# Altium footprint library ALL.PcbLib: 153 footprints (part 5 of 11)
Each footprint in its own frame and in the unit in brackets; x right, y up, seen from the top. Pads: shape width x height; smd on the part's side, far side on the other; paste and mask are expansions set on the pad; w line width, h text height; cw(c..) or ccw(c..) is an arc to the next point about the centre after c.
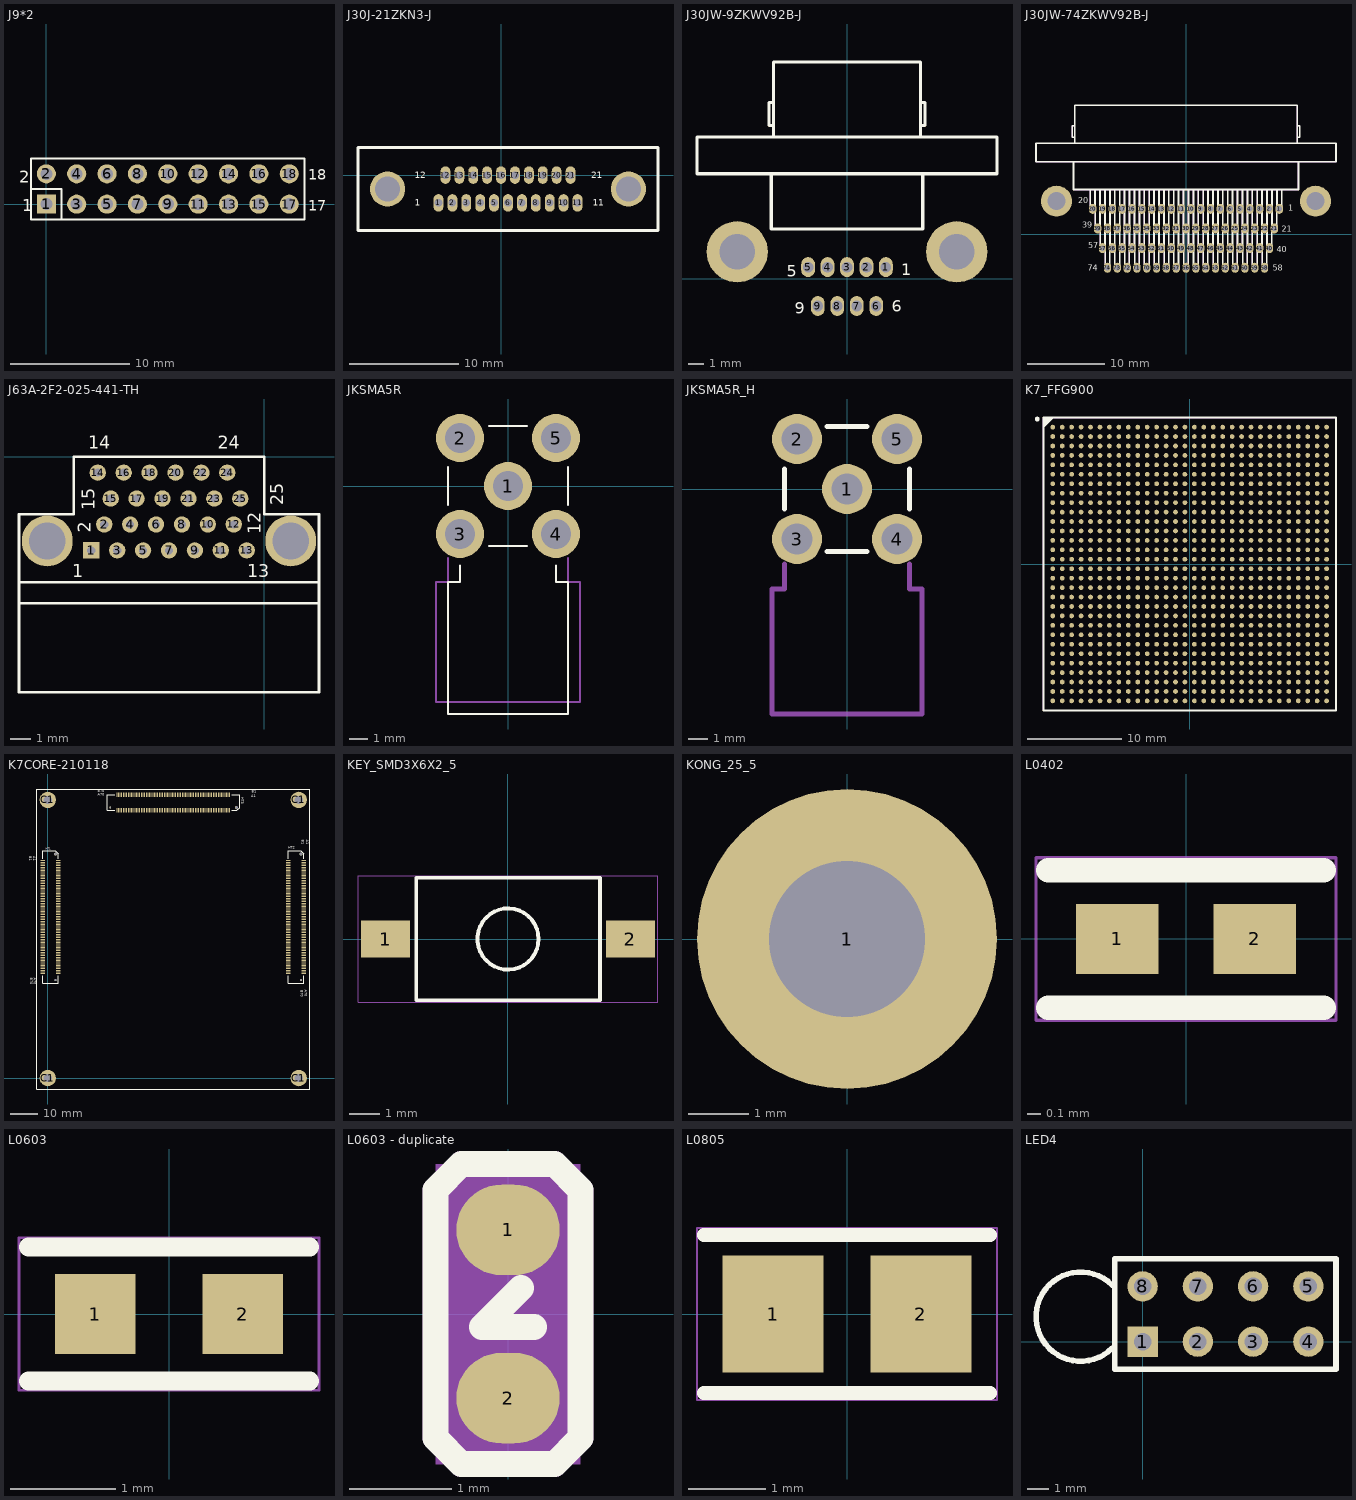
[diagram p4: the footprints below, top view; thin cyan lines are the x and y axes]

## J9*2 [mm]
pads (18):
  rect 1.6x1.6 hole 1: 1(0,0)
  round 1.6 hole 1: 2(0,2.54) 3(2.54,0) 4(2.54,2.54) 5(5.08,0) 6(5.08,2.54) 7(7.62,0) 8(7.62,2.54) 9(10.16,0) 10(10.16,2.54) 11(12.7,0) 12(12.7,2.54) 13(15.24,0) 14(15.24,2.54) 15(17.78,0) 16(17.78,2.54) 17(20.32,0) 18(20.32,2.54)
Top Overlay:
  lines w0.178: -1.27,1.27 1.27,1.27 1.27,-1.27 ; -1.27,-1.27 21.59,-1.27 21.59,3.81 -1.27,3.81 -1.27,-1.27
  text "18" at 21.895,2.032 h0.89
  text "17" at 21.92,-0.559 h0.89
  text "1" at -2.032,-0.584 h1.02
  text "2" at -2.286,1.778 h1.02

## J30J-21ZKN3-J [mm]
pads (23):
  oval 0.9x1.6 hole 0.7: 1(-5.715,-2.54) 2(-4.445,-2.54) 3(-3.175,-2.54) 4(-1.905,-2.54) 5(-0.635,-2.54) 6(0.635,-2.54) 7(1.905,-2.54) 8(3.175,-2.54) 9(4.445,-2.54) 10(5.715,-2.54) 11(6.985,-2.54) 12(-5.08,0) 13(-3.81,0) 14(-2.54,0) 15(-1.27,0) 16(0,0) 17(1.27,0) 18(2.54,0) 19(3.81,0) 20(5.08,0) 21(6.35,0)
  round 3.2 hole 2.3: ""(-10.365,-1.27) ""(11.635,-1.27)
Top Overlay:
  lines w0.254: -13.065,-5.07 14.335,-5.07 14.335,-1.27 14.335,2.53 -10.365,2.53 -13.065,2.53 -13.065,-1.27 -13.065,-5.07
  text "11" at 8.382,-3.048 h1.02
  text "1" at -7.874,-3.048 h1.02
  text "12" at -7.874,-0.508 h1.02
  text "21" at 8.255,-0.508 h1.02

## J30JW-9ZKWV92B-J [mm]
pads (11):
  oval 0.9x1.3 hole 0.7: 1(2.54,0.77) 2(1.27,0.77) 3(0,0.77) 4(-1.27,0.77) 5(-2.54,0.77) 6(1.905,-1.77) 7(0.635,-1.77) 8(-0.635,-1.77) 9(-1.905,-1.77)
  round 4 hole 2.3 unplated: ""(-7.175,1.77) ""(7.175,1.77)
Top Overlay:
  lines w0.203: -4.95,6.87 -4.95,3.27 4.95,3.27 4.95,6.87 ; -4.8,9.27 -4.8,14.17 -4.465,14.17 -2.675,14.17 -0.51,14.17 ; -4.8,10.02 -5.1,10.02 -5.1,10.82 -5.1,11.52 -4.8,11.52 ; -0.635,14.17 2.675,14.17 4.465,14.17 4.8,14.17 4.8,9.27 ; 4.8,10.02 5.1,10.02 5.1,10.82 5.1,11.52 4.8,11.52 ; -9.8,6.87 -9.8,9.27 8.3,9.27 9.8,9.27 9.8,6.87 -8.3,6.87 -9.8,6.87
  text "9" at -3.429,-2.286 h0.76
  text "5" at -3.937,0.127 h0.76
  text "6" at 2.921,-2.159 h0.76
  text "1" at 3.556,0.254 h0.76
Mechanical 1:
  lines w0.013: -8.3,6.87 -9.8,6.87 -9.8,9.27 -8.3,9.27 ; -4.95,3.27 -4.95,6.87 ; -4.8,9.27 -4.8,14.17 -4.465,14.17 -2.675,14.17 -0.51,14.17 ; -4.8,10.02 -5.1,10.02 -5.1,10.82 -5.1,11.52 -4.8,11.52 ; 0.51,14.17 2.675,14.17 4.465,14.17 4.8,14.17 4.8,9.27 ; 4.8,10.02 5.1,10.02 5.1,10.82 5.1,11.52 4.8,11.52 ; 4.95,3.27 4.95,6.87 ; 8.3,6.87 9.8,6.87 9.8,9.27 8.3,9.27

## J30JW-74ZKWV92B-J [mm]
pads (76):
  oval 0.95x1.3 hole 0.7: 1(12.065,3.31) 2(10.795,3.31) 3(9.525,3.31) 4(8.255,3.31) 5(6.985,3.31) 6(5.715,3.31) 7(4.445,3.31) 8(3.175,3.31) 9(1.905,3.31) 10(0.635,3.31) 11(-0.635,3.31) 12(-1.905,3.31) 13(-3.175,3.31) 14(-4.445,3.31) 15(-5.715,3.31) 16(-6.985,3.31) 17(-8.255,3.31) 18(-9.525,3.31) 19(-10.795,3.31) 20(-12.065,3.31) 21(11.43,0.77) 22(10.16,0.77) 23(8.89,0.77) 24(7.62,0.77) 25(6.35,0.77) 26(5.08,0.77) 27(3.81,0.77) 28(2.54,0.77) 29(1.27,0.77) 30(0,0.77) 31(-1.27,0.77) 32(-2.54,0.77) 33(-3.81,0.77) 34(-5.08,0.77) 35(-6.35,0.77) 36(-7.62,0.77) 37(-8.89,0.77) 38(-10.16,0.77) 39(-11.43,0.77) 40(10.795,-1.77) 41(9.525,-1.77) 42(8.255,-1.77) 43(6.985,-1.77) 44(5.715,-1.77) 45(4.445,-1.77) 46(3.175,-1.77) 47(1.905,-1.77) 48(0.635,-1.77) 49(-0.635,-1.77) 50(-1.905,-1.77) 51(-3.175,-1.77) 52(-4.445,-1.77) 53(-5.715,-1.77) 54(-6.985,-1.77) 55(-8.255,-1.77) 56(-9.525,-1.77) 57(-10.795,-1.77) 58(10.16,-4.31) 59(8.89,-4.31) 60(7.62,-4.31) 61(6.35,-4.31) 62(5.08,-4.31) 63(3.81,-4.31) 64(2.54,-4.31) 65(1.27,-4.31) 66(0,-4.31) 67(-1.27,-4.31) 68(-2.54,-4.31) 69(-3.81,-4.31) 70(-5.08,-4.31) 71(-6.35,-4.31) 72(-7.62,-4.31) 73(-8.89,-4.31) 74(-10.16,-4.31)
  round 4 hole 2.3: ""(-16.75,4.31) ""(16.75,4.31)
Top Overlay:
  drawing of 232 lines, arcs and shapes, not listed
  text "1" at 13.208,3.048 h0.76
  text "21" at 12.363,0.358 h0.76
  text "40" at 11.728,-2.309 h0.76
  text "58" at 11.22,-4.722 h0.76
  text "74" at -12.7,-4.691 h0.76
  text "57" at -12.656,-1.801 h0.76
  text "39" at -13.418,0.866 h0.76
  text "20" at -13.926,4.041 h0.76
Mechanical 1:
  drawing of 232 lines, arcs and shapes, not listed

## J63A-2F2-025-441-TH [mm]
pads (27):
  rect 0.8x0.8 hole 0.4: 1(-8.475,-4.58)
  round 0.8 hole 0.4: 2(-7.84,-3.31) 3(-7.205,-4.58) 4(-6.57,-3.31) 5(-5.935,-4.58) 6(-5.3,-3.31) 7(-4.665,-4.58) 8(-4.03,-3.31) 9(-3.395,-4.58) 10(-2.76,-3.31) 11(-2.125,-4.58) 12(-1.49,-3.31) 13(-0.855,-4.58) 14(-8.157,-0.77) 15(-7.522,-2.04) 16(-6.887,-0.77) 17(-6.252,-2.04) 18(-5.617,-0.77) 19(-4.982,-2.04) 20(-4.347,-0.77) 21(-3.712,-2.04) 22(-3.077,-0.77) 23(-2.442,-2.04) 24(-1.807,-0.77) 25(-1.172,-2.04)
  round 2.5 hole 1.8 unplated: ""(-10.635,-4.12) ""(1.305,-4.12)
Top Overlay:
  lines w0.127: -12.02,-7.17 2.69,-7.17 ; -12.02,-6.142 2.69,-6.142 ; -12.02,-11.54 -12.02,-2.8 -9.33,-2.8 -9.33,0 0,0 0,-2.8 2.69,-2.8 2.69,-11.54 -12.02,-11.54
  text "1" at -9.398,-5.905 h0.64
  text "13" at -0.826,-5.905 h0.64
  text "2" at -8.509,-3.708 h0.64
  text "15" at -8.306,-2.616 h0.64
  text "14" at -8.636,0.406 h0.64
  text "24" at -2.286,0.406 h0.64
  text "25" at 0.94,-2.362 h0.64
  text "12" at -0.178,-3.785 h0.64

## JKSMA5R [mil]
pads (5):
  round 100 hole 62: 1(0,0) 2(-100,100) 3(-100,-100) 4(100,-100) 5(100,100)
Top Overlay:
  lines w3.94: -125,-40 -125,40 ; -100,-165 -100,-200 -125,-200 -125,-475 125,-475 125,-200 100,-200 100,-165 ; -40,-125 40,-125 ; -40,125 40,125 ; 125,-40 125,40
Mechanical 1:
  lines w3.94: -125,-150 -125,-200 -150,-200 -150,-450 150,-450 150,-200 125,-200 125,-150

## JKSMA5R_H [mil]
pads (5):
  round 100 hole 62: 1(0,0) 2(-100,100) 3(-100,-100) 4(100,-100) 5(100,100)
Top Overlay:
  lines w10: -125,-40 -125,40 ; -40,-125 40,-125 ; -40,125 40,125 ; 125,-40 125,40
Mechanical 1:
  lines w10: -125,-150 -125,-200 -150,-200 -150,-450 150,-450 150,-200 125,-200 125,-150

## K7_FFG900 [mil] "K7_FFG900"
pads (900):
  round 19.68 smd: A1(-570.86,570.87) A2(-531.49,570.87) A3(-492.12,570.87) A4(-452.75,570.87) A5(-413.38,570.87) A6(-374.01,570.87) A7(-334.64,570.87) A8(-295.27,570.87) A9(-255.9,570.87) A10(-216.53,570.87) A11(-177.16,570.87) A12(-137.79,570.87) A13(-98.42,570.87) A14(-59.05,570.87) A15(-19.68,570.87) A16(19.69,570.87) A17(59.06,570.87) A18(98.43,570.87) A19(137.8,570.87) A20(177.17,570.87) A21(216.54,570.87) A22(255.91,570.87) A23(295.28,570.87) A24(334.65,570.87) A25(374.02,570.87) A26(413.39,570.87) A27(452.76,570.87) A28(492.13,570.87) A29(531.5,570.87) A30(570.87,570.87) AA1(-570.86,-216.53) AA2(-531.49,-216.53) AA3(-492.12,-216.53) AA4(-452.75,-216.53) AA5(-413.38,-216.53) AA6(-374.01,-216.53) AA7(-334.64,-216.53) AA8(-295.27,-216.53) AA9(-255.9,-216.53) AA10(-216.53,-216.53) AA11(-177.16,-216.53) AA12(-137.79,-216.53) AA13(-98.42,-216.53) AA14(-59.05,-216.53) AA15(-19.68,-216.53) AA16(19.69,-216.53) AA17(59.06,-216.53) AA18(98.43,-216.53) AA19(137.8,-216.53) AA20(177.17,-216.53) AA21(216.54,-216.53) AA22(255.91,-216.53) AA23(295.28,-216.53) AA24(334.65,-216.53) AA25(374.02,-216.53) AA26(413.39,-216.53) AA27(452.76,-216.53) AA28(492.13,-216.53) AA29(531.5,-216.53) AA30(570.87,-216.53) AB1(-570.86,-255.9) AB2(-531.49,-255.9) AB3(-492.12,-255.9) AB4(-452.75,-255.9) AB5(-413.38,-255.9) AB6(-374.01,-255.9) AB7(-334.64,-255.9) AB8(-295.27,-255.9) AB9(-255.9,-255.9) AB10(-216.53,-255.9) AB11(-177.16,-255.9) AB12(-137.79,-255.9) AB13(-98.42,-255.9) AB14(-59.05,-255.9) AB15(-19.68,-255.9) AB16(19.69,-255.9) AB17(59.06,-255.9) AB18(98.43,-255.9) AB19(137.8,-255.9) AB20(177.17,-255.9) AB21(216.54,-255.9) AB22(255.91,-255.9) AB23(295.28,-255.9) AB24(334.65,-255.9) AB25(374.02,-255.9) AB26(413.39,-255.9) AB27(452.76,-255.9) AB28(492.13,-255.9) AB29(531.5,-255.9) AB30(570.87,-255.9) AC1(-570.86,-295.27) AC2(-531.49,-295.27) AC3(-492.12,-295.27) AC4(-452.75,-295.27) AC5(-413.38,-295.27) AC6(-374.01,-295.27) AC7(-334.64,-295.27) AC8(-295.27,-295.27) AC9(-255.9,-295.27) AC10(-216.53,-295.27) AC11(-177.16,-295.27) AC12(-137.79,-295.27) AC13(-98.42,-295.27) AC14(-59.05,-295.27) AC15(-19.68,-295.27) AC16(19.69,-295.27) AC17(59.06,-295.27) AC18(98.43,-295.27) AC19(137.8,-295.27) AC20(177.17,-295.27) AC21(216.54,-295.27) AC22(255.91,-295.27) AC23(295.28,-295.27) AC24(334.65,-295.27) AC25(374.02,-295.27) AC26(413.39,-295.27) AC27(452.76,-295.27) AC28(492.13,-295.27) AC29(531.5,-295.27) AC30(570.87,-295.27) AD1(-570.86,-334.64) AD2(-531.49,-334.64) AD3(-492.12,-334.64) AD4(-452.75,-334.64) AD5(-413.38,-334.64) AD6(-374.01,-334.64) AD7(-334.64,-334.64) AD8(-295.27,-334.64) AD9(-255.9,-334.64) AD10(-216.53,-334.64) AD11(-177.16,-334.64) AD12(-137.79,-334.64) AD13(-98.42,-334.64) AD14(-59.05,-334.64) AD15(-19.68,-334.64) AD16(19.69,-334.64) AD17(59.06,-334.64) AD18(98.43,-334.64) AD19(137.8,-334.64) AD20(177.17,-334.64) AD21(216.54,-334.64) AD22(255.91,-334.64) AD23(295.28,-334.64) AD24(334.65,-334.64) AD25(374.02,-334.64) AD26(413.39,-334.64) AD27(452.76,-334.64) AD28(492.13,-334.64) AD29(531.5,-334.64) AD30(570.87,-334.64) AE1(-570.86,-374.01) AE2(-531.49,-374.01) AE3(-492.12,-374.01) AE4(-452.75,-374.01) AE5(-413.38,-374.01) AE6(-374.01,-374.01) AE7(-334.64,-374.01) AE8(-295.27,-374.01) AE9(-255.9,-374.01) AE10(-216.53,-374.01) AE11(-177.16,-374.01) AE12(-137.79,-374.01) AE13(-98.42,-374.01) AE14(-59.05,-374.01) AE15(-19.68,-374.01) AE16(19.69,-374.01) AE17(59.06,-374.01) AE18(98.43,-374.01) AE19(137.8,-374.01) AE20(177.17,-374.01) AE21(216.54,-374.01) AE22(255.91,-374.01) AE23(295.28,-374.01) AE24(334.65,-374.01) AE25(374.02,-374.01) AE26(413.39,-374.01) AE27(452.76,-374.01) AE28(492.13,-374.01) AE29(531.5,-374.01) AE30(570.87,-374.01) AF1(-570.86,-413.38) AF2(-531.49,-413.38) AF3(-492.12,-413.38) AF4(-452.75,-413.38) AF5(-413.38,-413.38) AF6(-374.01,-413.38) AF7(-334.64,-413.38) AF8(-295.27,-413.38) AF9(-255.9,-413.38) AF10(-216.53,-413.38) AF11(-177.16,-413.38) AF12(-137.79,-413.38) AF13(-98.42,-413.38) AF14(-59.05,-413.38) AF15(-19.68,-413.38) AF16(19.69,-413.38) AF17(59.06,-413.38) AF18(98.43,-413.38) AF19(137.8,-413.38) AF20(177.17,-413.38) AF21(216.54,-413.38) AF22(255.91,-413.38) AF23(295.28,-413.38) AF24(334.65,-413.38) AF25(374.02,-413.38) AF26(413.39,-413.38) AF27(452.76,-413.38) AF28(492.13,-413.38) AF29(531.5,-413.38) AF30(570.87,-413.38) AG1(-570.86,-452.75) AG2(-531.49,-452.75) AG3(-492.12,-452.75) AG4(-452.75,-452.75) AG5(-413.38,-452.75) AG6(-374.01,-452.75) AG7(-334.64,-452.75) AG8(-295.27,-452.75) AG9(-255.9,-452.75) AG10(-216.53,-452.75) AG11(-177.16,-452.75) AG12(-137.79,-452.75) AG13(-98.42,-452.75) AG14(-59.05,-452.75) AG15(-19.68,-452.75) AG16(19.69,-452.75) AG17(59.06,-452.75) AG18(98.43,-452.75) AG19(137.8,-452.75) AG20(177.17,-452.75) AG21(216.54,-452.75) AG22(255.91,-452.75) AG23(295.28,-452.75) AG24(334.65,-452.75) AG25(374.02,-452.75) AG26(413.39,-452.75) AG27(452.76,-452.75) AG28(492.13,-452.75) AG29(531.5,-452.75) AG30(570.87,-452.75) AH1(-570.86,-492.12) AH2(-531.49,-492.12) AH3(-492.12,-492.12) AH4(-452.75,-492.12) AH5(-413.38,-492.12) AH6(-374.01,-492.12) AH7(-334.64,-492.12) AH8(-295.27,-492.12) AH9(-255.9,-492.12) AH10(-216.53,-492.12) AH11(-177.16,-492.12) AH12(-137.79,-492.12) AH13(-98.42,-492.12) AH14(-59.05,-492.12) AH15(-19.68,-492.12) AH16(19.69,-492.12) AH17(59.06,-492.12) AH18(98.43,-492.12) AH19(137.8,-492.12) AH20(177.17,-492.12) AH21(216.54,-492.12) AH22(255.91,-492.12) AH23(295.28,-492.12) AH24(334.65,-492.12) AH25(374.02,-492.12) AH26(413.39,-492.12) AH27(452.76,-492.12) AH28(492.13,-492.12) AH29(531.5,-492.12) AH30(570.87,-492.12) AJ1(-570.86,-531.49) AJ2(-531.49,-531.49) AJ3(-492.12,-531.49) AJ4(-452.75,-531.49) AJ5(-413.38,-531.49) AJ6(-374.01,-531.49) AJ7(-334.64,-531.49) AJ8(-295.27,-531.49) AJ9(-255.9,-531.49) AJ10(-216.53,-531.49) AJ11(-177.16,-531.49) AJ12(-137.79,-531.49) AJ13(-98.42,-531.49) AJ14(-59.05,-531.49) AJ15(-19.68,-531.49) AJ16(19.69,-531.49) AJ17(59.06,-531.49) AJ18(98.43,-531.49) AJ19(137.8,-531.49) AJ20(177.17,-531.49) AJ21(216.54,-531.49) AJ22(255.91,-531.49) AJ23(295.28,-531.49) AJ24(334.65,-531.49) AJ25(374.02,-531.49) AJ26(413.39,-531.49) AJ27(452.76,-531.49) AJ28(492.13,-531.49) AJ29(531.5,-531.49) AJ30(570.87,-531.49) AK1(-570.86,-570.86) AK2(-531.49,-570.86) AK3(-492.12,-570.86) AK4(-452.75,-570.86) AK5(-413.38,-570.86) AK6(-374.01,-570.86) AK7(-334.64,-570.86) AK8(-295.27,-570.86) AK9(-255.9,-570.86) AK10(-216.53,-570.86) AK11(-177.16,-570.86) AK12(-137.79,-570.86) AK13(-98.42,-570.86) AK14(-59.05,-570.86) AK15(-19.68,-570.86) AK16(19.69,-570.86) AK17(59.06,-570.86) AK18(98.43,-570.86) AK19(137.8,-570.86) AK20(177.17,-570.86) AK21(216.54,-570.86) AK22(255.91,-570.86) AK23(295.28,-570.86) AK24(334.65,-570.86) AK25(374.02,-570.86) AK26(413.39,-570.86) AK27(452.76,-570.86) AK28(492.13,-570.86) AK29(531.5,-570.86) AK30(570.87,-570.86) B1(-570.86,531.5) B2(-531.49,531.5) B3(-492.12,531.5) B4(-452.75,531.5) B5(-413.38,531.5) B6(-374.01,531.5) B7(-334.64,531.5) B8(-295.27,531.5) B9(-255.9,531.5) B10(-216.53,531.5) B11(-177.16,531.5) B12(-137.79,531.5) B13(-98.42,531.5) B14(-59.05,531.5) B15(-19.68,531.5) B16(19.69,531.5) B17(59.06,531.5) B18(98.43,531.5) B19(137.8,531.5) B20(177.17,531.5) B21(216.54,531.5) B22(255.91,531.5) B23(295.28,531.5) B24(334.65,531.5) B25(374.02,531.5) B26(413.39,531.5) B27(452.76,531.5) B28(492.13,531.5) B29(531.5,531.5) B30(570.87,531.5) C1(-570.86,492.13) C2(-531.49,492.13) C3(-492.12,492.13) C4(-452.75,492.13) C5(-413.38,492.13) C6(-374.01,492.13) C7(-334.64,492.13) C8(-295.27,492.13) C9(-255.9,492.13) C10(-216.53,492.13) C11(-177.16,492.13) C12(-137.79,492.13) C13(-98.42,492.13) C14(-59.05,492.13) C15(-19.68,492.13) C16(19.69,492.13) C17(59.06,492.13) C18(98.43,492.13) C19(137.8,492.13) C20(177.17,492.13) C21(216.54,492.13) C22(255.91,492.13) C23(295.28,492.13) C24(334.65,492.13) C25(374.02,492.13) C26(413.39,492.13) C27(452.76,492.13) C28(492.13,492.13) C29(531.5,492.13) C30(570.87,492.13) D1(-570.86,452.76) D2(-531.49,452.76) D3(-492.12,452.76) D4(-452.75,452.76) D5(-413.38,452.76) D6(-374.01,452.76) D7(-334.64,452.76) D8(-295.27,452.76) D9(-255.9,452.76) D10(-216.53,452.76) D11(-177.16,452.76) D12(-137.79,452.76) D13(-98.42,452.76) D14(-59.05,452.76) D15(-19.68,452.76) D16(19.69,452.76) D17(59.06,452.76) D18(98.43,452.76) D19(137.8,452.76) D20(177.17,452.76) D21(216.54,452.76) D22(255.91,452.76) D23(295.28,452.76) D24(334.65,452.76) D25(374.02,452.76) D26(413.39,452.76) D27(452.76,452.76) D28(492.13,452.76) D29(531.5,452.76) D30(570.87,452.76) E1(-570.86,413.39) E2(-531.49,413.39) E3(-492.12,413.39) E4(-452.75,413.39) E5(-413.38,413.39) E6(-374.01,413.39) E7(-334.64,413.39) E8(-295.27,413.39) E9(-255.9,413.39) E10(-216.53,413.39) E11(-177.16,413.39) E12(-137.79,413.39) E13(-98.42,413.39) E14(-59.05,413.39) E15(-19.68,413.39) E16(19.69,413.39) E17(59.06,413.39) E18(98.43,413.39) E19(137.8,413.39) E20(177.17,413.39) E21(216.54,413.39) E22(255.91,413.39) E23(295.28,413.39) E24(334.65,413.39) E25(374.02,413.39) E26(413.39,413.39) E27(452.76,413.39) E28(492.13,413.39) E29(531.5,413.39) E30(570.87,413.39) F1(-570.86,374.02) F2(-531.49,374.02) F3(-492.12,374.02) F4(-452.75,374.02) F5(-413.38,374.02) F6(-374.01,374.02) F7(-334.64,374.02) F8(-295.27,374.02) F9(-255.9,374.02) F10(-216.53,374.02) F11(-177.16,374.02) F12(-137.79,374.02) F13(-98.42,374.02) F14(-59.05,374.02) F15(-19.68,374.02) F16(19.69,374.02) F17(59.06,374.02) F18(98.43,374.02) F19(137.8,374.02) F20(177.17,374.02) F21(216.54,374.02) F22(255.91,374.02) F23(295.28,374.02) F24(334.65,374.02) F25(374.02,374.02) F26(413.39,374.02) F27(452.76,374.02) F28(492.13,374.02) F29(531.5,374.02) F30(570.87,374.02) G1(-570.86,334.65) G2(-531.49,334.65) G3(-492.12,334.65) G4(-452.75,334.65) G5(-413.38,334.65) G6(-374.01,334.65) G7(-334.64,334.65) G8(-295.27,334.65) G9(-255.9,334.65) G10(-216.53,334.65) G11(-177.16,334.65) G12(-137.79,334.65) G13(-98.42,334.65) G14(-59.05,334.65) G15(-19.68,334.65) G16(19.69,334.65) G17(59.06,334.65) G18(98.43,334.65) G19(137.8,334.65) G20(177.17,334.65) G21(216.54,334.65) G22(255.91,334.65) G23(295.28,334.65) G24(334.65,334.65) G25(374.02,334.65) G26(413.39,334.65) G27(452.76,334.65) G28(492.13,334.65) G29(531.5,334.65) G30(570.87,334.65) H1(-570.86,295.28) H2(-531.49,295.28) H3(-492.12,295.28) H4(-452.75,295.28) H5(-413.38,295.28) H6(-374.01,295.28) H7(-334.64,295.28) H8(-295.27,295.28) H9(-255.9,295.28) H10(-216.53,295.28) H11(-177.16,295.28) H12(-137.79,295.28) H13(-98.42,295.28) H14(-59.05,295.28) H15(-19.68,295.28) H16(19.69,295.28) H17(59.06,295.28) H18(98.43,295.28) H19(137.8,295.28) H20(177.17,295.28) H21(216.54,295.28) H22(255.91,295.28) H23(295.28,295.28) H24(334.65,295.28) H25(374.02,295.28) H26(413.39,295.28) H27(452.76,295.28) H28(492.13,295.28) H29(531.5,295.28) H30(570.87,295.28) J1(-570.86,255.91) J2(-531.49,255.91) J3(-492.12,255.91) J4(-452.75,255.91) J5(-413.38,255.91) J6(-374.01,255.91) J7(-334.64,255.91) J8(-295.27,255.91) J9(-255.9,255.91) J10(-216.53,255.91) J11(-177.16,255.91) J12(-137.79,255.91) J13(-98.42,255.91) J14(-59.05,255.91) J15(-19.68,255.91) J16(19.69,255.91) J17(59.06,255.91) J18(98.43,255.91) J19(137.8,255.91) J20(177.17,255.91) J21(216.54,255.91) J22(255.91,255.91) J23(295.28,255.91) J24(334.65,255.91) J25(374.02,255.91) J26(413.39,255.91) J27(452.76,255.91) J28(492.13,255.91) J29(531.5,255.91) J30(570.87,255.91) K1(-570.86,216.54) K2(-531.49,216.54) K3(-492.12,216.54) K4(-452.75,216.54) K5(-413.38,216.54) K6(-374.01,216.54) K7(-334.64,216.54) K8(-295.27,216.54) K9(-255.9,216.54) K10(-216.53,216.54) K11(-177.16,216.54) K12(-137.79,216.54) K13(-98.42,216.54) K14(-59.05,216.54) K15(-19.68,216.54) K16(19.69,216.54) K17(59.06,216.54) K18(98.43,216.54) K19(137.8,216.54) K20(177.17,216.54) K21(216.54,216.54) K22(255.91,216.54) K23(295.28,216.54) K24(334.65,216.54) K25(374.02,216.54) K26(413.39,216.54) K27(452.76,216.54) K28(492.13,216.54) K29(531.5,216.54) K30(570.87,216.54) L1(-570.86,177.17) L2(-531.49,177.17) L3(-492.12,177.17) L4(-452.75,177.17) L5(-413.38,177.17) L6(-374.01,177.17) L7(-334.64,177.17) L8(-295.27,177.17) L9(-255.9,177.17) L10(-216.53,177.17) L11(-177.16,177.17) L12(-137.79,177.17) L13(-98.42,177.17) L14(-59.05,177.17) L15(-19.68,177.17) L16(19.69,177.17) L17(59.06,177.17) L18(98.43,177.17) L19(137.8,177.17) L20(177.17,177.17) L21(216.54,177.17) L22(255.91,177.17) L23(295.28,177.17) L24(334.65,177.17) L25(374.02,177.17) L26(413.39,177.17) L27(452.76,177.17) L28(492.13,177.17) L29(531.5,177.17) L30(570.87,177.17) M1(-570.86,137.8) M2(-531.49,137.8) M3(-492.12,137.8) M4(-452.75,137.8) M5(-413.38,137.8) M6(-374.01,137.8) M7(-334.64,137.8) M8(-295.27,137.8) M9(-255.9,137.8) M10(-216.53,137.8) M11(-177.16,137.8) M12(-137.79,137.8) M13(-98.42,137.8) M14(-59.05,137.8) M15(-19.68,137.8) M16(19.69,137.8) M17(59.06,137.8) M18(98.43,137.8) M19(137.8,137.8) M20(177.17,137.8) M21(216.54,137.8) M22(255.91,137.8) M23(295.28,137.8) M24(334.65,137.8) M25(374.02,137.8) M26(413.39,137.8) M27(452.76,137.8) M28(492.13,137.8) M29(531.5,137.8) M30(570.87,137.8) N1(-570.86,98.43) N2(-531.49,98.43) N3(-492.12,98.43) N4(-452.75,98.43) N5(-413.38,98.43) N6(-374.01,98.43) N7(-334.64,98.43) N8(-295.27,98.43) N9(-255.9,98.43) N10(-216.53,98.43) N11(-177.16,98.43) N12(-137.79,98.43) N13(-98.42,98.43) N14(-59.05,98.43) N15(-19.68,98.43) N16(19.69,98.43) N17(59.06,98.43) N18(98.43,98.43) N19(137.8,98.43) N20(177.17,98.43) N21(216.54,98.43) N22(255.91,98.43) N23(295.28,98.43) N24(334.65,98.43) N25(374.02,98.43) N26(413.39,98.43) N27(452.76,98.43) N28(492.13,98.43) N29(531.5,98.43) N30(570.87,98.43) P1(-570.86,59.06) P2(-531.49,59.06) P3(-492.12,59.06) P4(-452.75,59.06) P5(-413.38,59.06) P6(-374.01,59.06) P7(-334.64,59.06) P8(-295.27,59.06) P9(-255.9,59.06) P10(-216.53,59.06) P11(-177.16,59.06) P12(-137.79,59.06) P13(-98.42,59.06) P14(-59.05,59.06) P15(-19.68,59.06) P16(19.69,59.06) P17(59.06,59.06) P18(98.43,59.06) P19(137.8,59.06) P20(177.17,59.06) P21(216.54,59.06) P22(255.91,59.06) P23(295.28,59.06) P24(334.65,59.06) P25(374.02,59.06) P26(413.39,59.06) P27(452.76,59.06) P28(492.13,59.06) P29(531.5,59.06) P30(570.87,59.06) R1(-570.86,19.69) R2(-531.49,19.69) R3(-492.12,19.69) R4(-452.75,19.69) R5(-413.38,19.69) R6(-374.01,19.69) R7(-334.64,19.69) R8(-295.27,19.69) R9(-255.9,19.69) R10(-216.53,19.69) R11(-177.16,19.69) R12(-137.79,19.69) R13(-98.42,19.69) R14(-59.05,19.69) R15(-19.68,19.69) R16(19.69,19.69) R17(59.06,19.69) R18(98.43,19.69) R19(137.8,19.69) R20(177.17,19.69) R21(216.54,19.69) R22(255.91,19.69) R23(295.28,19.69) R24(334.65,19.69) R25(374.02,19.69) R26(413.39,19.69) R27(452.76,19.69) R28(492.13,19.69) R29(531.5,19.69) R30(570.87,19.69) T1(-570.86,-19.68) T2(-531.49,-19.68) T3(-492.12,-19.68) T4(-452.75,-19.68) T5(-413.38,-19.68) T6(-374.01,-19.68) T7(-334.64,-19.68) T8(-295.27,-19.68) T9(-255.9,-19.68) T10(-216.53,-19.68) T11(-177.16,-19.68) T12(-137.79,-19.68) T13(-98.42,-19.68) T14(-59.05,-19.68) T15(-19.68,-19.68) T16(19.69,-19.68) T17(59.06,-19.68) T18(98.43,-19.68) T19(137.8,-19.68) T20(177.17,-19.68) T21(216.54,-19.68) T22(255.91,-19.68) T23(295.28,-19.68) T24(334.65,-19.68) T25(374.02,-19.68) T26(413.39,-19.68) T27(452.76,-19.68) T28(492.13,-19.68) T29(531.5,-19.68) T30(570.87,-19.68) U1(-570.86,-59.05) U2(-531.49,-59.05) U3(-492.12,-59.05) U4(-452.75,-59.05) U5(-413.38,-59.05) U6(-374.01,-59.05) U7(-334.64,-59.05) U8(-295.27,-59.05) U9(-255.9,-59.05) U10(-216.53,-59.05) U11(-177.16,-59.05) U12(-137.79,-59.05) U13(-98.42,-59.05) U14(-59.05,-59.05) U15(-19.68,-59.05) U16(19.69,-59.05) U17(59.06,-59.05) U18(98.43,-59.05) U19(137.8,-59.05) U20(177.17,-59.05) U21(216.54,-59.05) U22(255.91,-59.05) U23(295.28,-59.05) U24(334.65,-59.05) U25(374.02,-59.05) U26(413.39,-59.05) U27(452.76,-59.05) U28(492.13,-59.05) U29(531.5,-59.05) U30(570.87,-59.05) V1(-570.86,-98.42) V2(-531.49,-98.42) V3(-492.12,-98.42) V4(-452.75,-98.42) V5(-413.38,-98.42) V6(-374.01,-98.42) V7(-334.64,-98.42) V8(-295.27,-98.42) V9(-255.9,-98.42) V10(-216.53,-98.42) V11(-177.16,-98.42) V12(-137.79,-98.42) V13(-98.42,-98.42) V14(-59.05,-98.42) V15(-19.68,-98.42) V16(19.69,-98.42) V17(59.06,-98.42) V18(98.43,-98.42) V19(137.8,-98.42) V20(177.17,-98.42) V21(216.54,-98.42) V22(255.91,-98.42) V23(295.28,-98.42) V24(334.65,-98.42) V25(374.02,-98.42) V26(413.39,-98.42) V27(452.76,-98.42) V28(492.13,-98.42) V29(531.5,-98.42) V30(570.87,-98.42) W1(-570.86,-137.79) W2(-531.49,-137.79) W3(-492.12,-137.79) W4(-452.75,-137.79) W5(-413.38,-137.79) W6(-374.01,-137.79) W7(-334.64,-137.79) W8(-295.27,-137.79) W9(-255.9,-137.79) W10(-216.53,-137.79) W11(-177.16,-137.79) W12(-137.79,-137.79) W13(-98.42,-137.79) W14(-59.05,-137.79) W15(-19.68,-137.79) W16(19.69,-137.79) W17(59.06,-137.79) W18(98.43,-137.79) W19(137.8,-137.79) W20(177.17,-137.79) W21(216.54,-137.79) W22(255.91,-137.79) W23(295.28,-137.79) W24(334.65,-137.79) W25(374.02,-137.79) W26(413.39,-137.79) W27(452.76,-137.79) W28(492.13,-137.79) W29(531.5,-137.79) W30(570.87,-137.79) Y1(-570.86,-177.16) Y2(-531.49,-177.16) Y3(-492.12,-177.16) Y4(-452.75,-177.16) Y5(-413.38,-177.16) Y6(-374.01,-177.16) Y7(-334.64,-177.16) Y8(-295.27,-177.16) Y9(-255.9,-177.16) Y10(-216.53,-177.16) Y11(-177.16,-177.16) Y12(-137.79,-177.16) Y13(-98.42,-177.16) Y14(-59.05,-177.16) Y15(-19.68,-177.16) Y16(19.69,-177.16) Y17(59.06,-177.16) Y18(98.43,-177.16) Y19(137.8,-177.16) Y20(177.17,-177.16) Y21(216.54,-177.16) Y22(255.91,-177.16) Y23(295.28,-177.16) Y24(334.65,-177.16) Y25(374.02,-177.16) Y26(413.39,-177.16) Y27(452.76,-177.16) Y28(492.13,-177.16) Y29(531.5,-177.16) Y30(570.87,-177.16)
Top Overlay:
  circle w9.84: c-635.82,604.33 r4.92
  dashed: -570.86,610.24 -610.23,570.87 -610.23,610.24
  lines w7.87: -610.23,570.87 -570.86,610.24 ; -610.23,-610.23 -610.23,610.24 610.24,610.24 610.24,-610.23 -610.23,-610.23
  text ".Designator" at 656,191 h30
Mechanical 7:
  lines w1: -610.23,-610.23 -610.23,610.24 610.24,610.24 610.24,-610.23 -610.23,-610.23

## K7CORE-210118 [mm] "TT202101182204"
pads (430):
  rect 1.7x0.35 smd mask+0.102: A1_1(3.85,79.7) A1_2(3.85,79.1) A1_3(3.85,78.5) A1_4(3.85,77.9) A1_5(3.85,77.3) A1_6(3.85,76.7) A1_7(3.85,76.1) A1_8(3.85,75.5) A1_9(3.85,74.9) A1_10(3.85,74.3) A1_11(3.85,73.7) A1_12(3.85,73.1) A1_13(3.85,72.5) A1_14(3.85,71.9) A1_15(3.85,71.3) A1_16(3.85,70.7) A1_17(3.85,70.1) A1_18(3.85,69.5) A1_19(3.85,68.9) A1_20(3.85,68.3) A1_21(3.85,67.7) A1_22(3.85,67.1) A1_23(3.85,66.5) A1_24(3.85,65.9) A1_25(3.85,65.3) A1_26(3.85,64.7) A1_27(3.85,64.1) A1_28(3.85,63.5) A1_29(3.85,62.9) A1_30(3.85,62.3) A1_31(3.85,61.7) A1_32(3.85,61.1) A1_33(3.85,60.5) A1_34(3.85,59.9) A1_35(3.85,59.3) A1_36(3.85,58.7) A1_37(3.85,58.1) A1_38(3.85,57.5) A1_39(3.85,56.9) A1_40(3.85,56.3) A1_41(3.85,55.7) A1_42(3.85,55.1) A1_43(3.85,54.5) A1_44(3.85,53.9) A1_45(3.85,53.3) A1_46(3.85,52.7) A1_47(3.85,52.1) A1_48(3.85,51.5) A1_49(3.85,50.9) A1_50(3.85,50.3) A1_51(3.85,49.7) A1_52(3.85,49.1) A1_53(3.85,48.5) A1_54(3.85,47.9) A1_55(3.85,47.3) A1_56(3.85,46.7) A1_57(3.85,46.1) A1_58(3.85,45.5) A1_59(3.85,44.9) A1_60(3.85,44.3) A1_61(3.85,43.7) A1_62(3.85,43.1) A1_63(3.85,42.5) A1_64(3.85,41.9) A1_65(3.85,41.3) A1_66(3.85,40.7) A1_67(3.85,40.1) A1_68(3.85,39.5) A1_69(3.85,38.9) A1_70(3.85,38.3) A2_1(93.85,79.7) A2_2(93.85,79.1) A2_3(93.85,78.5) A2_4(93.85,77.9) A2_5(93.85,77.3) A2_6(93.85,76.7) A2_7(93.85,76.1) A2_8(93.85,75.5) A2_9(93.85,74.9) A2_10(93.85,74.3) A2_11(93.85,73.7) A2_12(93.85,73.1) A2_13(93.85,72.5) A2_14(93.85,71.9) A2_15(93.85,71.3) A2_16(93.85,70.7) A2_17(93.85,70.1) A2_18(93.85,69.5) A2_19(93.85,68.9) A2_20(93.85,68.3) A2_21(93.85,67.7) A2_22(93.85,67.1) A2_23(93.85,66.5) A2_24(93.85,65.9) A2_25(93.85,65.3) A2_26(93.85,64.7) A2_27(93.85,64.1) A2_28(93.85,63.5) A2_29(93.85,62.9) A2_30(93.85,62.3) A2_31(93.85,61.7) A2_32(93.85,61.1) A2_33(93.85,60.5) A2_34(93.85,59.9) A2_35(93.85,59.3) A2_36(93.85,58.7) A2_37(93.85,58.1) A2_38(93.85,57.5) A2_39(93.85,56.9) A2_40(93.85,56.3) A2_41(93.85,55.7) A2_42(93.85,55.1) A2_43(93.85,54.5) A2_44(93.85,53.9) A2_45(93.85,53.3) A2_46(93.85,52.7) A2_47(93.85,52.1) A2_48(93.85,51.5) A2_49(93.85,50.9) A2_50(93.85,50.3) A2_51(93.85,49.7) A2_52(93.85,49.1) A2_53(93.85,48.5) A2_54(93.85,47.9) A2_55(93.85,47.3) A2_56(93.85,46.7) A2_57(93.85,46.1) A2_58(93.85,45.5) A2_59(93.85,44.9) A2_60(93.85,44.3) A2_61(93.85,43.7) A2_62(93.85,43.1) A2_63(93.85,42.5) A2_64(93.85,41.9) A2_65(93.85,41.3) A2_66(93.85,40.7) A2_67(93.85,40.1) A2_68(93.85,39.5) A2_69(93.85,38.9) A2_70(93.85,38.3) B1_1(-1.85,79.7) B1_2(-1.85,79.1) B1_3(-1.85,78.5) B1_4(-1.85,77.9) B1_5(-1.85,77.3) B1_6(-1.85,76.7) B1_7(-1.85,76.1) B1_8(-1.85,75.5) B1_9(-1.85,74.9) B1_10(-1.85,74.3) B1_11(-1.85,73.7) B1_12(-1.85,73.1) B1_13(-1.85,72.5) B1_14(-1.85,71.9) B1_15(-1.85,71.3) B1_16(-1.85,70.7) B1_17(-1.85,70.1) B1_18(-1.85,69.5) B1_19(-1.85,68.9) B1_20(-1.85,68.3) B1_21(-1.85,67.7) B1_22(-1.85,67.1) B1_23(-1.85,66.5) B1_24(-1.85,65.9) B1_25(-1.85,65.3) B1_26(-1.85,64.7) B1_27(-1.85,64.1) B1_28(-1.85,63.5) B1_29(-1.85,62.9) B1_30(-1.85,62.3) B1_31(-1.85,61.7) B1_32(-1.85,61.1) B1_33(-1.85,60.5) B1_34(-1.85,59.9) B1_35(-1.85,59.3) B1_36(-1.85,58.7) B1_37(-1.85,58.1) B1_38(-1.85,57.5) B1_39(-1.85,56.9) B1_40(-1.85,56.3) B1_41(-1.85,55.7) B1_42(-1.85,55.1) B1_43(-1.85,54.5) B1_44(-1.85,53.9) B1_45(-1.85,53.3) B1_46(-1.85,52.7) B1_47(-1.85,52.1) B1_48(-1.85,51.5) B1_49(-1.85,50.9) B1_50(-1.85,50.3) B1_51(-1.85,49.7) B1_52(-1.85,49.1) B1_53(-1.85,48.5) B1_54(-1.85,47.9) B1_55(-1.85,47.3) B1_56(-1.85,46.7) B1_57(-1.85,46.1) B1_58(-1.85,45.5) B1_59(-1.85,44.9) B1_60(-1.85,44.3) B1_61(-1.85,43.7) B1_62(-1.85,43.1) B1_63(-1.85,42.5) B1_64(-1.85,41.9) B1_65(-1.85,41.3) B1_66(-1.85,40.7) B1_67(-1.85,40.1) B1_68(-1.85,39.5) B1_69(-1.85,38.9) B1_70(-1.85,38.3) B2_1(88.15,79.7) B2_2(88.15,79.1) B2_3(88.15,78.5) B2_4(88.15,77.9) B2_5(88.15,77.3) B2_6(88.15,76.7) B2_7(88.15,76.1) B2_8(88.15,75.5) B2_9(88.15,74.9) B2_10(88.15,74.3) B2_11(88.15,73.7) B2_12(88.15,73.1) B2_13(88.15,72.5) B2_14(88.15,71.9) B2_15(88.15,71.3) B2_16(88.15,70.7) B2_17(88.15,70.1) B2_18(88.15,69.5) B2_19(88.15,68.9) B2_20(88.15,68.3) B2_21(88.15,67.7) B2_22(88.15,67.1) B2_23(88.15,66.5) B2_24(88.15,65.9) B2_25(88.15,65.3) B2_26(88.15,64.7) B2_27(88.15,64.1) B2_28(88.15,63.5) B2_29(88.15,62.9) B2_30(88.15,62.3) B2_31(88.15,61.7) B2_32(88.15,61.1) B2_33(88.15,60.5) B2_34(88.15,59.9) B2_35(88.15,59.3) B2_36(88.15,58.7) B2_37(88.15,58.1) B2_38(88.15,57.5) B2_39(88.15,56.9) B2_40(88.15,56.3) B2_41(88.15,55.7) B2_42(88.15,55.1) B2_43(88.15,54.5) B2_44(88.15,53.9) B2_45(88.15,53.3) B2_46(88.15,52.7) B2_47(88.15,52.1) B2_48(88.15,51.5) B2_49(88.15,50.9) B2_50(88.15,50.3) B2_51(88.15,49.7) B2_52(88.15,49.1) B2_53(88.15,48.5) B2_54(88.15,47.9) B2_55(88.15,47.3) B2_56(88.15,46.7) B2_57(88.15,46.1) B2_58(88.15,45.5) B2_59(88.15,44.9) B2_60(88.15,44.3) B2_61(88.15,43.7) B2_62(88.15,43.1) B2_63(88.15,42.5) B2_64(88.15,41.9) B2_65(88.15,41.3) B2_66(88.15,40.7) B2_67(88.15,40.1) B2_68(88.15,39.5) B2_69(88.15,38.9) B2_70(88.15,38.3)
  rect 0.35x1.7 smd mask+0.102: A3_1(66.7,98.15) A3_2(66.1,98.15) A3_3(65.5,98.15) A3_4(64.9,98.15) A3_5(64.3,98.15) A3_6(63.7,98.15) A3_7(63.1,98.15) A3_8(62.5,98.15) A3_9(61.9,98.15) A3_10(61.3,98.15) A3_11(60.7,98.15) A3_12(60.1,98.15) A3_13(59.5,98.15) A3_14(58.9,98.15) A3_15(58.3,98.15) A3_16(57.7,98.15) A3_17(57.1,98.15) A3_18(56.5,98.15) A3_19(55.9,98.15) A3_20(55.3,98.15) A3_21(54.7,98.15) A3_22(54.1,98.15) A3_23(53.5,98.15) A3_24(52.9,98.15) A3_25(52.3,98.15) A3_26(51.7,98.15) A3_27(51.1,98.15) A3_28(50.5,98.15) A3_29(49.9,98.15) A3_30(49.3,98.15) A3_31(48.7,98.15) A3_32(48.1,98.15) A3_33(47.5,98.15) A3_34(46.9,98.15) A3_35(46.3,98.15) A3_36(45.7,98.15) A3_37(45.1,98.15) A3_38(44.5,98.15) A3_39(43.9,98.15) A3_40(43.3,98.15) A3_41(42.7,98.15) A3_42(42.1,98.15) A3_43(41.5,98.15) A3_44(40.9,98.15) A3_45(40.3,98.15) A3_46(39.7,98.15) A3_47(39.1,98.15) A3_48(38.5,98.15) A3_49(37.9,98.15) A3_50(37.3,98.15) A3_51(36.7,98.15) A3_52(36.1,98.15) A3_53(35.5,98.15) A3_54(34.9,98.15) A3_55(34.3,98.15) A3_56(33.7,98.15) A3_57(33.1,98.15) A3_58(32.5,98.15) A3_59(31.9,98.15) A3_60(31.3,98.15) A3_61(30.7,98.15) A3_62(30.1,98.15) A3_63(29.5,98.15) A3_64(28.9,98.15) A3_65(28.3,98.15) A3_66(27.7,98.15) A3_67(27.1,98.15) A3_68(26.5,98.15) A3_69(25.9,98.15) A3_70(25.3,98.15) B3_1(66.7,103.85) B3_2(66.1,103.85) B3_3(65.5,103.85) B3_4(64.9,103.85) B3_5(64.3,103.85) B3_6(63.7,103.85) B3_7(63.1,103.85) B3_8(62.5,103.85) B3_9(61.9,103.85) B3_10(61.3,103.85) B3_11(60.7,103.85) B3_12(60.1,103.85) B3_13(59.5,103.85) B3_14(58.9,103.85) B3_15(58.3,103.85) B3_16(57.7,103.85) B3_17(57.1,103.85) B3_18(56.5,103.85) B3_19(55.9,103.85) B3_20(55.3,103.85) B3_21(54.7,103.85) B3_22(54.1,103.85) B3_23(53.5,103.85) B3_24(52.9,103.85) B3_25(52.3,103.85) B3_26(51.7,103.85) B3_27(51.1,103.85) B3_28(50.5,103.85) B3_29(49.9,103.85) B3_30(49.3,103.85) B3_31(48.7,103.85) B3_32(48.1,103.85) B3_33(47.5,103.85) B3_34(46.9,103.85) B3_35(46.3,103.85) B3_36(45.7,103.85) B3_37(45.1,103.85) B3_38(44.5,103.85) B3_39(43.9,103.85) B3_40(43.3,103.85) B3_41(42.7,103.85) B3_42(42.1,103.85) B3_43(41.5,103.85) B3_44(40.9,103.85) B3_45(40.3,103.85) B3_46(39.7,103.85) B3_47(39.1,103.85) B3_48(38.5,103.85) B3_49(37.9,103.85) B3_50(37.3,103.85) B3_51(36.7,103.85) B3_52(36.1,103.85) B3_53(35.5,103.85) B3_54(34.9,103.85) B3_55(34.3,103.85) B3_56(33.7,103.85) B3_57(33.1,103.85) B3_58(32.5,103.85) B3_59(31.9,103.85) B3_60(31.3,103.85) B3_61(30.7,103.85) B3_62(30.1,103.85) B3_63(29.5,103.85) B3_64(28.9,103.85) B3_65(28.3,103.85) B3_66(27.7,103.85) B3_67(27.1,103.85) B3_68(26.5,103.85) B3_69(25.9,103.85) B3_70(25.3,103.85)
  round 6 hole 3: C1(0,0) C1(0,102) C1(92,0) C1(92,102)
  round 0.7 hole 0.7 unplated: ""(2.8,35.9) ""(22.9,99.2) ""(92.8,35.9)
  round 1.1 hole 1.1 unplated: ""(2.8,82.1) ""(69.1,99.2) ""(92.8,82.1)
Top Overlay:
  lines w0.178: -1.8,37.6 -1.8,34.7 3.8,34.7 3.8,37.6 ; -1.8,80.4 -1.8,83.3 2.8,83.3 3.8,82.3 3.8,80.4 ; 24.6,98.2 21.7,98.2 21.7,103.8 24.6,103.8 ; 67.4,98.2 69.3,98.2 70.3,99.2 70.3,103.8 67.4,103.8 ; 88.2,37.6 88.2,34.7 93.8,34.7 93.8,37.6 ; 88.2,80.4 88.2,83.3 92.8,83.3 93.8,82.3 93.8,80.4 ; -4,-4 -4,106 96,106 96,-4 -4,-4
  text "HT3" at 70.609,102.885 h1.52
  text "HT2" at 88.212,83.81 h1.52
  text "HT1" at -0.79,83.581 h0.76
  text "A1" at -5.794,81.386 h1.52
  text "A70" at -5.591,36.809 h1.52
  text "B70" at -6.75,36.809 h1.52
  text "B1" at -7.14,81.386 h1.52
  text "A1" at 74.648,102.595 h1.52
  text "A70" at 18.25,103.103 h1.52
  text "B70" at 18.387,104.373 h1.52
  text "B1" at 74.775,104.246 h1.52
  text "A1" at 94.333,87.482 h1.52
  text "A70" at 93.85,32.364 h1.52
  text "B70" at 92.428,32.237 h1.52
  text "B1" at 92.809,87.355 h1.52

## KEY_SMD3X6X2_5 [mm] "KEY_SMD3X6X2_5"
pads (2):
  rect 1.6x1.2 smd: 1(-4,0) 2(4,0)
Top Overlay:
  circle w0.127: c0,0 r1
  lines w0.127: -3,-2 3.004,-2 3,-1.996 3,2 -3,2 -3,-2
  text ".Designator" at -6.043,-2.095 h0.76
Mechanical 7:
  lines w0.025: -4.901,-2.063 -4.901,2.063 4.902,2.063 4.902,-2.063 -4.901,-2.063

## KONG_25_5 [mm]
pads (1):
  round 5 hole 2.6: 1(0,0)

## L0402 [mil] "L0402"
pads (2):
  rect 23.62x20 smd: 1(-19.69,0) 2(19.68,0)
Top Overlay:
  lines w7: -39.37,-19.69 39.37,-19.69 ; -39.37,19.68 39.37,19.68
Mechanical 7:
  lines w1: -42.87,-23.19 -42.87,23.18 42.87,23.18 42.87,-23.19 -42.87,-23.19
Mechanical 16:
  text ".Designator" at 0,0 h30

## L0603 [mil] "L0603"
pads (2):
  rect 30x30 smd: 1(-27.5,0) 2(27.5,0)
Top Overlay:
  lines w7: -52.5,-25 52.5,-25 ; -52.5,25 52.5,25
  text ".Designator" at -2,98 h30
Mechanical 7:
  lines w1: -56,-28.5 56,-28.5 56,28.5 -56,28.5 -56,-28.5

## L0603 - duplicate [mil] "L0603"
pads (2):
  oval 40x35 smd: 1(0,32.5) 2(0,-32.5)
Top Overlay:
  lines w10: 5,10 -10,-5 10,-5 ; -28,-48 -18,-58 18,-58 28,-48 28,48 18,58 -18,58 -28,48 -28,-48
Mechanical 5:
  lines w10: -25,-51.01 -28,-48 -28,48 -25,51.01 ; -21,-54.99 -18,-58 18,-58 21,-54.99 ; -21,54.99 -18,58 18,58 21,54.99 ; 5,10 -10,-5 10,-5 ; 25,-51.01 28,-48 28,48 25,51.01
Mechanical 14:
  text "2" at 11.2,-32.5 h28
  text "1" at 11.2,32.5 h28
Mechanical 16:
  region: -19.7,-35.4 19.7,-35.4 19.7,35.4 -19.7,35.4
  pour cut-out: -28,-58 28,-58 28,58 -28,58
  lines w1: -19.7,-35.4 19.7,-35.4 19.7,35.4 -19.7,35.4 -19.7,-35.4
3D body: height 150, standoff 0, extent -19.7,-35.4 19.7,35.4

## L0805 [mm] "L0805"
pads (2):
  rect 1.3x1.5 smd: 1(-0.95,0) 2(0.95,0)
Top Overlay:
  lines w0.178: -1.841,-1.019 1.841,-1.019 ; -1.841,1.019 1.841,1.019
  text ".Designator" at 3.404,1.511 h0.76
Mechanical 7:
  lines w0.025: -1.93,-1.107 -1.93,1.107 1.93,1.107 1.93,-1.107 -1.93,-1.107

## LED4 [mil]
pads (8):
  rect 55x55 / inner round 55 / far side rect 55x55 hole 32: 1(0,0)
  round 55 hole 32: 2(100,0) 3(200,0) 4(300,0) 5(300,100) 6(200,100) 7(100,100) 8(0,100)
Top Overlay:
  lines w10: -55.12,-11.81 cw(c-112.2,45.28) -55.12,102.36 ; -50,-50 350,-50 350,150 -50,150 -50,-50